# Altium footprint library hphonglib.PcbLib: 703 footprints (part 39 of 44)
Each footprint in its own frame and in the unit in brackets; x right, y up, seen from the top. Pads: shape width x height; smd on the part's side, far side on the other; paste and mask are expansions set on the pad; w line width, h text height; cw(c..) or ccw(c..) is an arc to the next point about the centre after c.
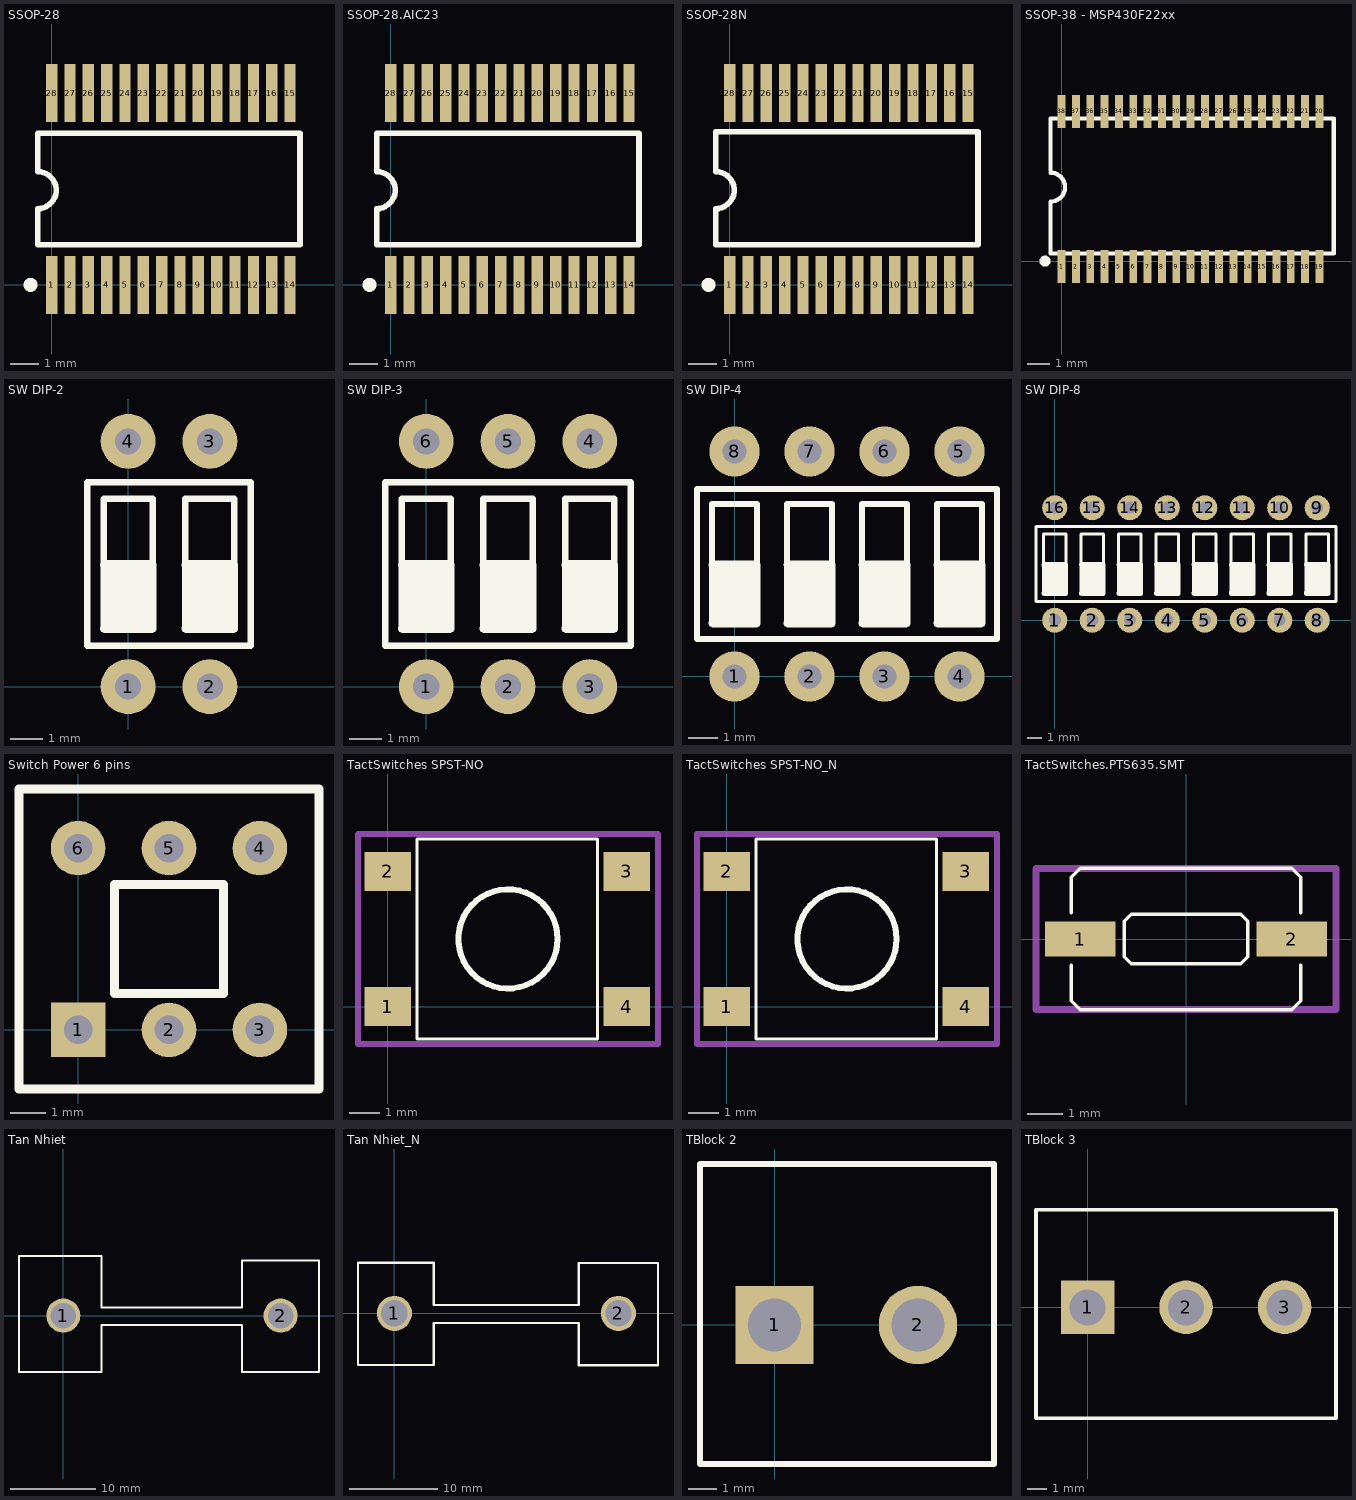
[diagram p38: the footprints below, top view; thin cyan lines are the x and y axes]

## SSOP-28 [mm] "SSOP, Plastic; 28 Leads; Body Width 5.2 mm; Pitch 0.65 mm"
height 1.99
pads (28):
  rect 0.4x2.05 smd: 1(0,0) 2(0.65,0) 3(1.3,0) 4(1.95,0) 5(2.6,0) 6(3.25,0) 7(3.9,0) 8(4.55,0) 9(5.2,0) 10(5.85,0) 11(6.5,0) 12(7.15,0) 13(7.8,0) 14(8.45,0) 15(8.45,6.8) 16(7.8,6.8) 17(7.15,6.8) 18(6.5,6.8) 19(5.85,6.8) 20(5.2,6.8) 21(4.55,6.8) 22(3.9,6.8) 23(3.25,6.8) 24(2.6,6.8) 25(1.95,6.8) 26(1.3,6.8) 27(0.65,6.8) 28(0,6.8)
Top Overlay:
  circle w0.25: c-0.75,0 r0.125
  lines w0.2: -0.5,4.017 cw(c-0.5,3.358) -0.5,2.7 -0.5,1.425 8.8,1.425 8.8,5.375 -0.5,5.375 -0.5,4.1
3D body: height 0.1, standoff 0, extent 0.492,5.6 0.808,6.708
3D body: height 0.1, standoff 0, extent -0.158,5.6 0.158,6.708
3D body: height 0.1, standoff 0, extent 3.092,5.6 3.408,6.708
3D body: height 0.1, standoff 0, extent 2.442,5.6 2.758,6.708
3D body: height 0.1, standoff 0, extent 1.792,5.6 2.108,6.708
3D body: height 0.1, standoff 0, extent 1.142,5.6 1.458,6.708
3D body: height 0.1, standoff 0, extent 5.692,5.6 6.008,6.708
3D body: height 0.1, standoff 0, extent 5.042,5.6 5.358,6.708
3D body: height 0.1, standoff 0, extent 4.392,5.6 4.708,6.708
3D body: height 0.1, standoff 0, extent 3.742,5.6 4.058,6.708
3D body: height 0.1, standoff 0, extent 8.292,5.6 8.608,6.708
3D body: height 0.1, standoff 0, extent 7.642,5.6 7.958,6.708
3D body: height 0.1, standoff 0, extent 6.992,5.6 7.308,6.708
3D body: height 0.1, standoff 0, extent 6.342,5.6 6.658,6.708
3D body: height 0.1, standoff 0, extent 7.642,0.092 7.958,1.2
3D body: height 0.1, standoff 0, extent 8.292,0.092 8.608,1.2
3D body: height 0.1, standoff 0, extent 5.042,0.092 5.358,1.2
3D body: height 0.1, standoff 0, extent 5.692,0.092 6.008,1.2
3D body: height 0.1, standoff 0, extent 6.342,0.092 6.658,1.2
3D body: height 0.1, standoff 0, extent 6.992,0.092 7.308,1.2
3D body: height 0.1, standoff 0, extent 2.442,0.092 2.758,1.2
3D body: height 0.1, standoff 0, extent 3.092,0.092 3.408,1.2
3D body: height 0.1, standoff 0, extent 3.742,0.092 4.058,1.2
3D body: height 0.1, standoff 0, extent 4.392,0.092 4.708,1.2
3D body: height 0.1, standoff 0, extent 1.792,0.092 2.108,1.2
3D body: height 0.1, standoff 0, extent 1.142,0.092 1.458,1.2
3D body: height 0.1, standoff 0, extent 0.492,0.092 0.808,1.2
3D body: height 0.1, standoff 0, extent -0.158,0.092 0.158,1.2
3D body: height 1.2, standoff 0.15, extent -0.7,1.15 9.1,5.65
3D body: height 1.2, standoff 1.19, extent 0.671,2.515 1.957,4.31
3D body: height 1.2, standoff 1.19, extent 2.193,2.518 2.957,4.31
3D body: height 1.2, standoff 1.19, extent 3.468,2.518 4.73,4.307
3D body: height 1.2, standoff 1.19, extent 4.965,2.518 6.257,4.307
3D body: height 1.2, standoff 1.19, extent 6.49,2.515 7.782,4.31

## SSOP-28.AIC23 [mm] "SSOP, Plastic; 28 Leads; Body Width 5.2 mm; Pitch 0.65 mm"
height 1.99
pads (28):
  rect 0.4x2.05 smd: 1(0,0) 2(0.65,0) 3(1.3,0) 4(1.95,0) 5(2.6,0) 6(3.25,0) 7(3.9,0) 8(4.55,0) 9(5.2,0) 10(5.85,0) 11(6.5,0) 12(7.15,0) 13(7.8,0) 14(8.45,0) 15(8.45,6.8) 16(7.8,6.8) 17(7.15,6.8) 18(6.5,6.8) 19(5.85,6.8) 20(5.2,6.8) 21(4.55,6.8) 22(3.9,6.8) 23(3.25,6.8) 24(2.6,6.8) 25(1.95,6.8) 26(1.3,6.8) 27(0.65,6.8) 28(0,6.8)
Top Overlay:
  circle w0.25: c-0.75,0 r0.125
  lines w0.2: -0.5,4.017 cw(c-0.5,3.358) -0.5,2.7 -0.5,1.425 8.8,1.425 8.8,5.375 -0.5,5.375 -0.5,4.1
3D body: height 0.1, standoff 0, extent 0.492,5.6 0.808,6.708
3D body: height 0.1, standoff 0, extent -0.158,5.6 0.158,6.708
3D body: height 0.1, standoff 0, extent 3.092,5.6 3.408,6.708
3D body: height 0.1, standoff 0, extent 2.442,5.6 2.758,6.708
3D body: height 0.1, standoff 0, extent 1.792,5.6 2.108,6.708
3D body: height 0.1, standoff 0, extent 1.142,5.6 1.458,6.708
3D body: height 0.1, standoff 0, extent 5.692,5.6 6.008,6.708
3D body: height 0.1, standoff 0, extent 5.042,5.6 5.358,6.708
3D body: height 0.1, standoff 0, extent 4.392,5.6 4.708,6.708
3D body: height 0.1, standoff 0, extent 3.742,5.6 4.058,6.708
3D body: height 0.1, standoff 0, extent 8.292,5.6 8.608,6.708
3D body: height 0.1, standoff 0, extent 7.642,5.6 7.958,6.708
3D body: height 0.1, standoff 0, extent 6.992,5.6 7.308,6.708
3D body: height 0.1, standoff 0, extent 6.342,5.6 6.658,6.708
3D body: height 0.1, standoff 0, extent 7.642,0.092 7.958,1.2
3D body: height 0.1, standoff 0, extent 8.292,0.092 8.608,1.2
3D body: height 0.1, standoff 0, extent 5.042,0.092 5.358,1.2
3D body: height 0.1, standoff 0, extent 5.692,0.092 6.008,1.2
3D body: height 0.1, standoff 0, extent 6.342,0.092 6.658,1.2
3D body: height 0.1, standoff 0, extent 6.992,0.092 7.308,1.2
3D body: height 0.1, standoff 0, extent 2.442,0.092 2.758,1.2
3D body: height 0.1, standoff 0, extent 3.092,0.092 3.408,1.2
3D body: height 0.1, standoff 0, extent 3.742,0.092 4.058,1.2
3D body: height 0.1, standoff 0, extent 4.392,0.092 4.708,1.2
3D body: height 0.1, standoff 0, extent 1.792,0.092 2.108,1.2
3D body: height 0.1, standoff 0, extent 1.142,0.092 1.458,1.2
3D body: height 0.1, standoff 0, extent 0.492,0.092 0.808,1.2
3D body: height 0.1, standoff 0, extent -0.158,0.092 0.158,1.2
3D body: height 1.2, standoff 0.15, extent -0.7,1.15 9.1,5.65
3D body: height 1.2, standoff 1.19, extent 0.671,2.515 1.957,4.31
3D body: height 1.2, standoff 1.19, extent 2.193,2.518 2.957,4.31
3D body: height 1.2, standoff 1.19, extent 3.468,2.518 4.73,4.307
3D body: height 1.2, standoff 1.19, extent 4.965,2.518 6.257,4.307
3D body: height 1.2, standoff 1.19, extent 6.49,2.515 7.782,4.31

## SSOP-28N [mm] "SSOP, Plastic; 28 Leads; Body Width 5.2 mm; Pitch 0.65 mm"
height 1.99
pads (28):
  rect 0.4x2.05 smd: 1(0,0) 2(0.65,0) 3(1.3,0) 4(1.95,0) 5(2.6,0) 6(3.25,0) 7(3.9,0) 8(4.55,0) 9(5.2,0) 10(5.85,0) 11(6.5,0) 12(7.15,0) 13(7.8,0) 14(8.45,0) 15(8.45,6.8) 16(7.8,6.8) 17(7.15,6.8) 18(6.5,6.8) 19(5.85,6.8) 20(5.2,6.8) 21(4.55,6.8) 22(3.9,6.8) 23(3.25,6.8) 24(2.6,6.8) 25(1.95,6.8) 26(1.3,6.8) 27(0.65,6.8) 28(0,6.8)
Top Overlay:
  circle w0.25: c-0.75,0 r0.125
  lines w0.2: -0.5,4.017 cw(c-0.5,3.358) -0.5,2.7 -0.5,1.425 8.8,1.425 8.8,5.375 ; -0.5,4.1 -0.5,5.375 ; -0.5,5.425 8.8,5.425
3D body: height 1.92, standoff -0.03, extent -1.025,-0.725 9.475,7.5

## SSOP-38 - MSP430F22xx [mm] "SSOP, Plastic; 38 Leads; Body Width 5.2 mm; Pitch 0.65 mm"
height 1.99
pads (38):
  rect 0.356x1.5 smd: 1(0,-0.25) 2(0.65,-0.25) 3(1.3,-0.25) 4(1.95,-0.25) 5(2.6,-0.25) 6(3.25,-0.25) 7(3.9,-0.25) 8(4.55,-0.25) 9(5.2,-0.25) 10(5.85,-0.25) 11(6.5,-0.25) 12(7.15,-0.25) 13(7.8,-0.25) 14(8.45,-0.25) 15(9.1,-0.25) 16(9.75,-0.25) 17(10.4,-0.25) 18(11.05,-0.25) 19(11.7,-0.25) 20(11.7,6.8) 21(11.05,6.8) 22(10.4,6.8) 23(9.75,6.8) 24(9.1,6.8) 25(8.45,6.8) 26(7.8,6.8) 27(7.15,6.8) 28(6.5,6.8) 29(5.85,6.8) 30(5.2,6.8) 31(4.55,6.8) 32(3.9,6.8) 33(3.25,6.8) 34(2.6,6.8) 35(1.95,6.8) 36(1.3,6.8) 37(0.65,6.8) 38(0,6.8)
Top Overlay:
  circle w0.25: c-0.75,0 r0.125
  lines w0.2: -0.5,4.017 cw(c-0.5,3.358) -0.5,2.7 -0.5,0.35 12.35,0.35 12.35,6.475 -0.5,6.475 -0.5,4.1

## SW DIP-2 [mil] "Switch; 4 Leads; Solder Pad 35mil"
pads (4):
  round 67 hole 32: 1(0,0) 2(100,0) 3(100,300) 4(0,300)
Top Overlay:
  region: 133.06,153.06 134.33,150 134.33,70 133.06,66.94 130,65.67 70,65.67 66.94,66.94 65.67,70 70,110 65.67,150 66.94,153.06 70,154.33 130,154.33
  region: 33.06,153.06 34.33,150 34.33,70 33.06,66.94 30,65.67 -30,65.67 -33.06,66.94 -34.33,70 -30,110 -34.33,150 -33.06,153.06 -30,154.33 30,154.33
  lines w8: -50,50 150,50 150,250 -50,250 -50,200 -50,50 ; -30,70 -30,230 30,230 30,70 -30,70 ; 70,70 70,230 130,230 130,70 70,70
3D body: height 145.67, standoff -275.59, extent -69.37,-44.88 170,344.88

## SW DIP-3 [mil] "Switch; 6 Leads; Solder Pad 35mil"
pads (6):
  round 67 hole 32: 1(0,0) 2(100,0) 3(200,0) 4(200,300) 5(100,300) 6(0,300)
Top Overlay:
  region: 233.06,153.06 234.33,150 234.33,70 233.06,66.94 230,65.67 170,65.67 166.94,66.94 165.67,70 170,110 165.67,150 166.94,153.06 170,154.33 230,154.33
  region: 33.06,153.06 34.33,150 34.33,70 33.06,66.94 30,65.67 -30,65.67 -33.06,66.94 -34.33,70 -30,110 -34.33,150 -33.06,153.06 -30,154.33 30,154.33
  region: 133.06,153.06 134.33,150 134.33,70 133.06,66.94 130,65.67 70,65.67 66.94,66.94 65.67,70 70,110 65.67,150 66.94,153.06 70,154.33 130,154.33
  lines w8: -50,50 -50,200 -50,250 250,250 250,50 -50,50 ; -30,70 30,70 30,230 -30,230 -30,70 ; 70,70 130,70 130,230 70,230 70,70 ; 170,70 170,230 230,230 230,70 170,70
3D body: height 275.59, standoff -145.67, extent -69.68,-44.88 269.7,344.89

## SW DIP-4 [mil] "Switch; 8 Leads; Solder Pad 35mil"
pads (8):
  round 67 hole 32: 1(0,0) 2(100,0) 3(200,0) 4(300,0) 5(300,300) 6(200,300) 7(100,300) 8(0,300)
Top Overlay:
  region: 133.06,153.06 134.33,150 134.33,70 133.06,66.94 130,65.67 70,65.67 66.94,66.94 65.67,70 70,110 65.67,150 66.94,153.06 70,154.33 130,154.33
  region: 33.06,153.06 34.33,150 34.33,70 33.06,66.94 30,65.67 -30,65.67 -33.06,66.94 -34.33,70 -30,110 -34.33,150 -33.06,153.06 -30,154.33 30,154.33
  region: 233.06,153.06 234.33,150 234.33,70 233.06,66.94 230,65.67 170,65.67 166.94,66.94 165.67,70 170,110 165.67,150 166.94,153.06 170,154.33 230,154.33
  region: 333.06,153.06 334.33,150 334.33,70 333.06,66.94 330,65.67 270,65.67 266.94,66.94 265.67,70 270,110 265.67,150 266.94,153.06 270,154.33 330,154.33
  lines w8: -50,50 350,50 350,250 -50,250 -50,200 -50,50 ; -30,70 -30,230 30,230 30,70 -30,70 ; 70,70 70,230 130,230 130,70 70,70 ; 170,70 230,70 230,230 170,230 170,70 ; 270,70 330,70 330,230 270,230 270,70
3D body: height 275.59, standoff -145.67, extent -69.69,-45 369.69,344.77

## SW DIP-8 [mil] "Switch; 16 Leads; Solder Pad 35mil"
pads (16):
  round 67 hole 32: 1(0,0) 2(100,0) 3(200,0) 4(300,0) 5(400,0) 6(500,0) 7(600,0) 8(700,0) 9(700,300) 10(600,300) 11(500,300) 12(400,300) 13(300,300) 14(200,300) 15(100,300) 16(0,300)
Top Overlay:
  region: 733.06,153.06 734.33,150 734.33,70 733.06,66.94 730,65.67 670,65.67 666.94,66.94 665.67,70 670,110 665.67,150 666.94,153.06 670,154.33 730,154.33
  region: 633.06,153.06 634.33,150 634.33,70 633.06,66.94 630,65.67 570,65.67 566.94,66.94 565.67,70 570,110 565.67,150 566.94,153.06 570,154.33 630,154.33
  region: 533.06,153.06 534.33,150 534.33,70 533.06,66.94 530,65.67 470,65.67 466.94,66.94 465.67,70 470,110 465.67,150 466.94,153.06 470,154.33 530,154.33
  region: 433.06,153.06 434.33,150 434.33,70 433.06,66.94 430,65.67 370,65.67 366.94,66.94 365.67,70 370,110 365.67,150 366.94,153.06 370,154.33 430,154.33
  region: 333.06,153.06 334.33,150 334.33,70 333.06,66.94 330,65.67 270,65.67 266.94,66.94 265.67,70 270,110 265.67,150 266.94,153.06 270,154.33 330,154.33
  region: 233.06,153.06 234.33,150 234.33,70 233.06,66.94 230,65.67 170,65.67 166.94,66.94 165.67,70 170,110 165.67,150 166.94,153.06 170,154.33 230,154.33
  region: 33.06,153.06 34.33,150 34.33,70 33.06,66.94 30,65.67 -30,65.67 -33.06,66.94 -34.33,70 -30,110 -34.33,150 -33.06,153.06 -30,154.33 30,154.33
  region: 133.06,153.06 134.33,150 134.33,70 133.06,66.94 130,65.67 70,65.67 66.94,66.94 65.67,70 70,110 65.67,150 66.94,153.06 70,154.33 130,154.33
  lines w8: -50,50 -50,200 -50,250 750,250 750,50 -50,50 ; -30,70 30,70 30,230 -30,230 -30,70 ; 70,70 130,70 130,230 70,230 70,70 ; 170,70 170,230 230,230 230,70 170,70 ; 270,70 270,230 330,230 330,70 270,70 ; 370,70 430,70 430,230 370,230 370,70 ; 470,70 530,70 530,230 470,230 470,70 ; 570,70 630,70 630,230 570,230 570,70 ; 670,70 730,70 730,230 670,230 670,70
3D body: height 275.59, standoff -145.67, extent -69.68,-44.88 769.69,344.89

## Switch Power 6 pins [mil] "Switch Power 6 pins"
pads (6):
  rect 60x60 hole 31.5: 1(0,0)
  round 60 hole 31.5: 2(100,0) 3(200,0) 4(200,200) 5(100,200) 6(0,200)
Top Overlay:
  lines w10: -65,-65 -65,265 265,265 265,-65 -65,-65 ; 40,40 160,40 160,160 40,160 40,40
3D body: height 118.11, standoff 3.94, extent -60.12,-60.04 259.84,260.83
3D body: height 236.22, standoff 196.85, extent 40.27,40.27 159.53,160.51
3D body: height 275.59, standoff 236.22, extent 60.04,59.06 140.75,139.76
3D body: height 196.85, standoff 118.11, extent -56.47,-57.09 256.89,255.62

## TactSwitches SPST-NO [mm] "SWITCH TACT 6MM 230GF H=4.3MM"
pads (4):
  rect 1.55x1.3 smd: 1(0,0) 2(0,4.5) 3(7.95,4.5) 4(7.95,0)
Top Overlay:
  circle w0.2: c4,2.25 r1.65
  lines w0.1: 0.975,-1.075 6.975,-1.075 6.975,5.575 0.975,5.575 0.975,-1.075
Mechanical 13:
  lines w0.2: -0.991,-1.245 8.992,-1.245 8.992,5.74 -0.991,5.74 -0.991,-1.245
3D body: height 0.15, standoff 0.01, extent 6.9,-0.354 8.504,0.354
3D body: height 0.15, standoff 0.01, extent 6.9,4.146 8.504,4.854
3D body: height 0.15, standoff 0.01, extent -0.504,-0.354 1.1,0.354
3D body: height 0.15, standoff 0.01, extent -0.504,4.146 1.1,4.854
3D body: height 4.3, standoff 3, extent 2.242,0.492 5.758,4.008
3D body: height 2, standoff 0.1, extent 1,-1 7,5.5
3D body: height 3.65, standoff 2, extent 0.75,-1.25 7.25,5.75

## TactSwitches SPST-NO_N [mm] "SWITCH TACT 6MM 230GF H=4.3MM"
pads (4):
  rect 1.55x1.3 smd: 1(0,0) 2(0,4.5) 3(7.95,4.5) 4(7.95,0)
Top Overlay:
  circle w0.2: c4,2.25 r1.65
  lines w0.1: 0.975,-1.075 0.975,5.575 6.975,5.575 6.975,-1.075 0.975,-1.075
Mechanical 13:
  lines w0.2: -0.991,-1.245 -0.991,5.74 8.992,5.74 8.992,-1.245 -0.991,-1.245
3D body: height 2.5, standoff 0, extent 0.432,-0.989 7.632,5.511

## TactSwitches.PTS635.SMT [mil] "3,5 mm Tact Switches, PTS635 Series"
pads (2):
  rect 79x39 smd: 1(-118,0) 2(118,0)
Top Overlay:
  lines w3.94: -127.95,-29.53 -127.95,-68.9 -118.11,-78.74 118.11,-78.74 127.95,-68.9 127.95,-29.53 ; -127.95,29.53 -127.95,68.9 -118.11,78.74 118.11,78.74 127.95,68.9 127.95,29.53 ; -68.9,-19.68 -61.02,-27.56 61.02,-27.56 68.9,-19.68 68.9,-9.84 68.9,19.68 61.02,27.56 -61.02,27.56 -68.9,19.68 -68.9,-19.68
Mechanical 13:
  lines w7.87: -167.32,-78.74 -167.32,78.74 167.32,78.74 167.32,-78.74 -167.32,-78.74
3D body: height 30, standoff 0, extent 120,-12.5 135,12.5
3D body: height 30, standoff 0, extent -135,-12.5 -120,12.5
3D body: height 55, standoff 0, extent -120,-70 120,70
3D body: height 80, standoff 55, extent -95,-50 100,50
3D body: height 100, standoff 80, extent -65,-22.36 65,22.64

## Tan Nhiet [mm]
pads (2):
  round 4 hole 3: 1(0,0) 2(25.5,0)
Top Overlay:
  lines w0.254: -5.2,-6.6 4.475,-6.6 4.475,-1.1 20.975,-1.1 20.975,-6.6 30,-6.6 30,6.45 20.975,6.45 20.975,0.95 4.475,0.95 4.475,6.975 -5.2,6.975 -5.2,-6.6
Bottom Overlay:
  circle w0.254: c25.5,0 r1.652
  circle w0.254: c0,0 r1.652
3D body: height 25, standoff 0.1, extent 1.7,-1.1 23.725,0.975
3D body: height 25, standoff 0.1, extent 20.975,0.95 30,6.6
3D body: height 25, standoff 0.1, extent -4.5,-6.6 4.475,-1.1
3D body: height 25, standoff 0.1, extent -4.5,0.9 4.5,6.45
3D body: height 25, standoff 0.1, extent 20.975,-6.625 29.975,-1.075

## Tan Nhiet_N [mm]
pads (2):
  round 4 hole 3: 1(0,0) 2(25.5,0)
Top Overlay:
  lines w0.254: -4.14,-5.867 -4.14,5.766 4.475,5.766 4.475,0.95 20.975,0.95 20.975,5.74 30,5.74 30,-5.918 20.975,-5.918 20.975,-1.1 4.475,-1.1 4.475,-5.867 -4.14,-5.867
Bottom Overlay:
  circle w0.254: c0,0 r1.652
  circle w0.254: c25.5,0 r1.652
3D body: height 25, standoff -3.4, extent -4.022,-5.885 29.778,5.715

## TBlock 2 [mil] "Connector; Terminal; 2 Positions; Solder Pad 35mil"
pads (2):
  rect 107x107 hole 72: 1(0,0)
  round 107 hole 72: 2(196,0)
Top Overlay:
  lines w7.87: -102,-190 -102,220 300,220 300,-190 -102,-190
3D body: height 560.07, standoff -136.8, extent -121.66,-189 295.67,216.52

## TBlock 3 [mil] "Connector; Terminal; 3 Positions; Solder Pad 35mil"
pads (3):
  rect 107x107 hole 72: 1(0,0)
  round 107 hole 72: 2(197,0) 3(394,0)
Top Overlay:
  lines w7.87: -103,-222 -103,195 497,195 497,-222 -103,-222
3D body: height 120.8, standoff -576.07, extent -98.28,-216 515.9,189.52